# Altium footprint library connector_degson.PcbLib: 59 footprints (part 2 of 4)
Each footprint in its own frame and in the unit in brackets; x right, y up, seen from the top. Pads: shape width x height; smd on the part's side, far side on the other; paste and mask are expansions set on the pad; w line width, h text height; cw(c..) or ccw(c..) is an arc to the next point about the centre after c.
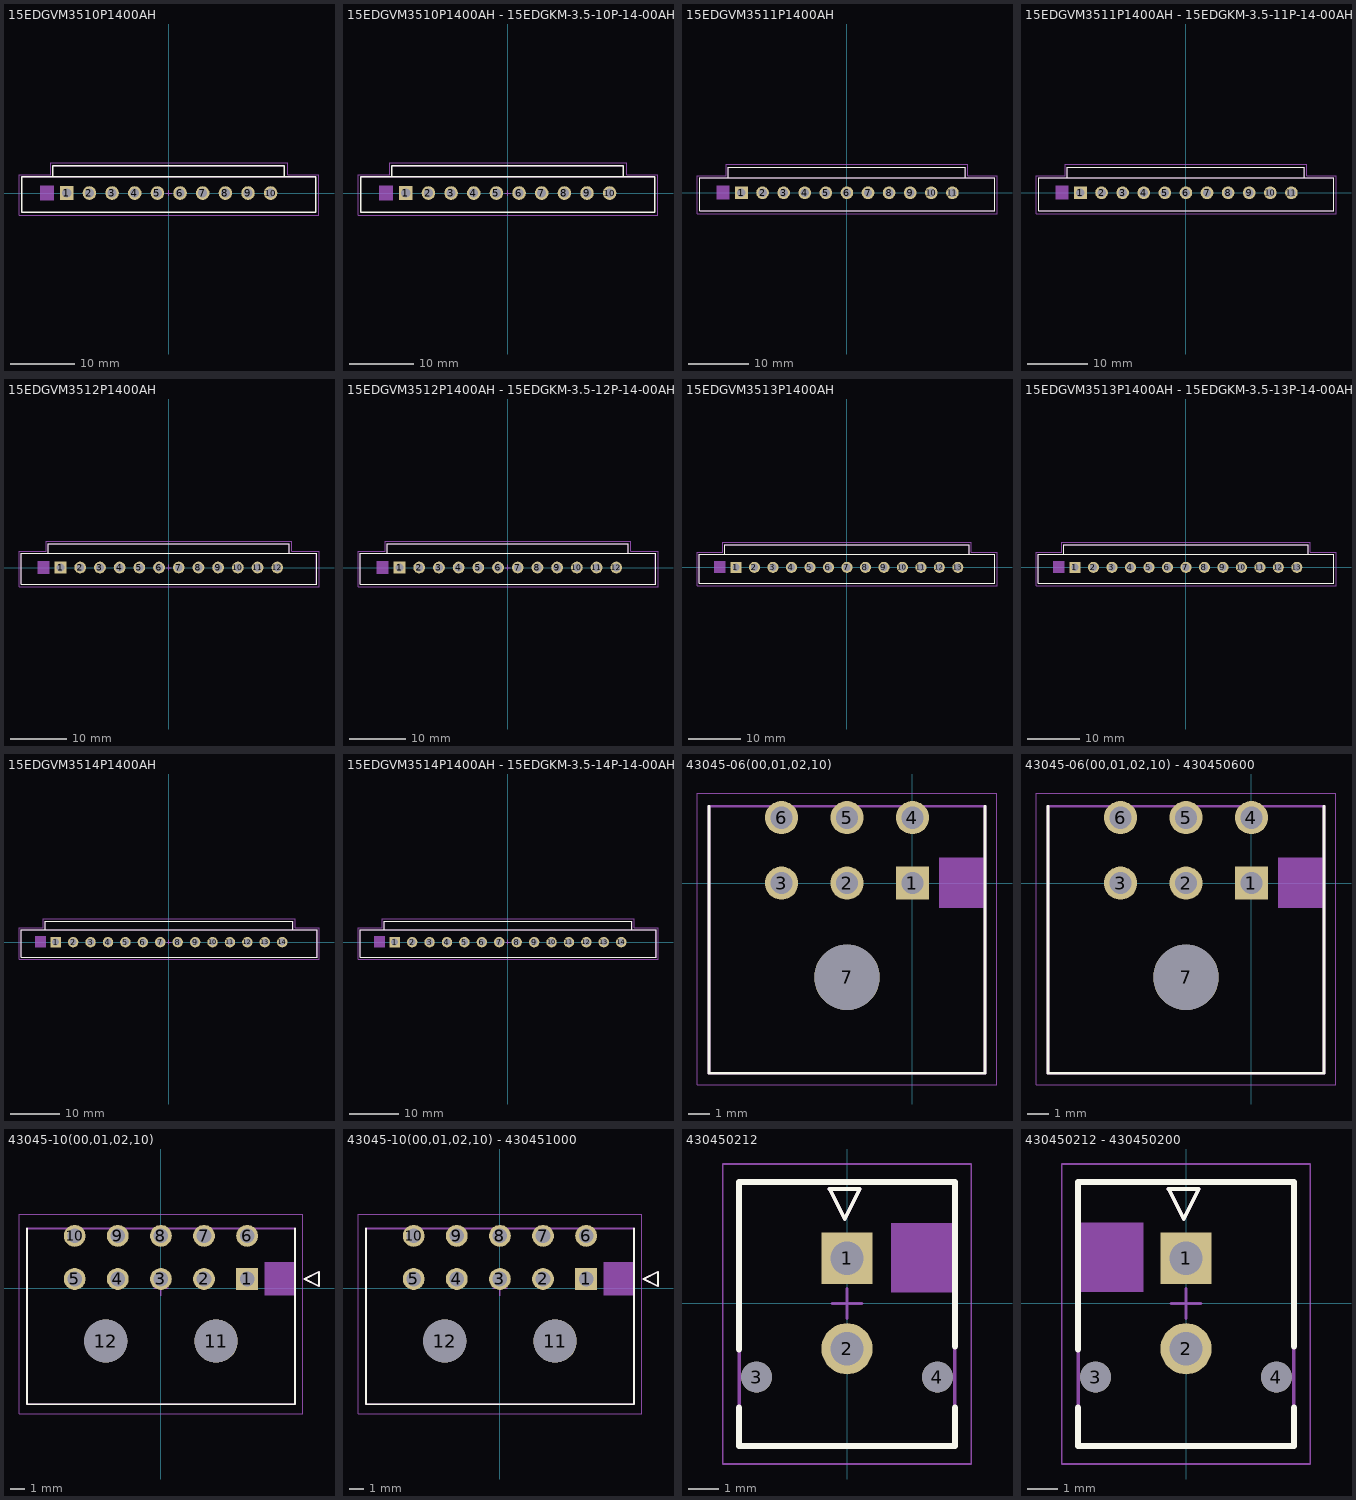
[diagram p1: the footprints below, top view; thin cyan lines are the x and y axes]

## 15EDGVM3510P1400AH [mm] "15EDGVM-3.5-10P-14-00A"
height 3.4
pads (10):
  rect 2.1x2.1 hole 1.4: 1(-15.75,0)
  round 2.1 hole 1.4: 2(-12.25,0) 3(-8.75,0) 4(-5.25,0) 5(-1.75,0) 6(1.75,0) 7(5.25,0) 8(8.75,0) 9(12.25,0) 10(15.75,0)
Top Overlay:
  lines w0.2: -17.9,2.5 -17.9,4.24 17.879,4.24 17.879,2.5 ; -22.7,-3 22.75,-3 22.75,2.5 -22.7,2.5 -22.7,-3
Top Designator:
  text ".Designator" at -24.849,3.475 h0.6
Top Assembly:
  rectangle: -19.866,-1.114 -17.708,1.192
  lines w0.1: -17.9,2.5 -17.9,4.24 17.928,4.24 17.928,2.5 ; -22.7,-3 22.75,-3 22.75,2.5 -22.7,2.5 -22.7,-3
Top Courtyard:
  lines w0.1: -23.125,-3.45 23.217,-3.45 23.217,2.85 18.354,2.85 18.354,4.7 -18.25,4.7 -18.25,2.85 -23.125,2.85 -23.125,-3.45
  lines w0.15: -0.45,0 0.45,0 ; 0,-0.45 0,0.45
3D body "15EDGVM-3.5-10P-14-00AH.STEP": height 9.35, standoff -3.3, extent -22.7,-3 22.7,4.2

## 15EDGVM3510P1400AH - 15EDGKM-3.5-10P-14-00AH [mm] "15EDGVM-3.5-10P-14-00A"
height 3.4
pads (10):
  rect 2.1x2.1 hole 1.4: 1(-15.75,0)
  round 2.1 hole 1.4: 2(-12.25,0) 3(-8.75,0) 4(-5.25,0) 5(-1.75,0) 6(1.75,0) 7(5.25,0) 8(8.75,0) 9(12.25,0) 10(15.75,0)
Top Overlay:
  lines w0.2: -17.9,2.5 -17.9,4.24 17.879,4.24 17.879,2.5 ; -22.7,-3 -22.7,2.5 22.75,2.5 22.75,-3 -22.7,-3
Top Designator:
  text ".Designator" at -24.849,3.475 h0.6
Top Assembly:
  rectangle: -19.866,-1.114 -17.708,1.192
  lines w0.1: -17.9,2.5 -17.9,4.24 17.928,4.24 17.928,2.5 ; -22.7,-3 -22.7,2.5 22.75,2.5 22.75,-3 -22.7,-3
Top Courtyard:
  lines w0.1: -23.125,-3.45 -23.125,2.85 -18.25,2.85 -18.25,4.7 18.354,4.7 18.354,2.85 23.217,2.85 23.217,-3.45 -23.125,-3.45
  lines w0.15: -0.45,0 0.45,0 ; 0,-0.45 0,0.45
3D body "15EDGKM-3.5-10P-14-00AH.STEP": height 18.6, standoff 3, extent -22.7,-6.6 22.7,4.5
3D body "15EDGVM-3.5-10P-14-00AH.STEP": height 9.35, standoff -3.3, extent -22.7,-3 22.7,4.2

## 15EDGVM3511P1400AH [mm] "15EDGVM-3.5-11P-14-00A"
height 3.4
pads (11):
  rect 2.1x2.1 hole 1.4: 1(-17.5,0)
  round 2.1 hole 1.4: 2(-14,0) 3(-10.5,0) 4(-7,0) 5(-3.5,0) 6(0,0) 7(3.5,0) 8(7,0) 9(10.5,0) 10(14,0) 11(17.5,0)
Top Overlay:
  lines w0.2: -19.65,2.5 -19.65,4.24 19.659,4.24 19.659,2.5 ; -24.45,-3 -24.45,2.5 24.5,2.5 24.5,-3 -24.45,-3
Top Designator:
  text ".Designator" at -26.599,3.475 h0.6
Top Assembly:
  rectangle: -21.616,-1.114 -19.458,1.192
  lines w0.1: -19.65,2.5 -19.65,4.24 19.716,4.24 19.716,2.5 ; -24.45,-3 -24.45,2.5 24.5,2.5 24.5,-3 -24.45,-3
Top Courtyard:
  lines w0.1: -24.875,-3.45 -24.875,2.85 -20,2.85 -20,4.7 20.058,4.7 20.058,2.85 24.902,2.85 24.902,-3.45 -24.875,-3.45
  lines w0.15: -0.45,0 0.45,0 ; 0,-0.45 0,0.45
3D body "15EDGVM-3.5-11P-14-00AH.STEP": height 9.35, standoff -3.3, extent -24.425,-3 24.475,4.2

## 15EDGVM3511P1400AH - 15EDGKM-3.5-11P-14-00AH [mm] "15EDGVM-3.5-11P-14-00A"
height 3.4
pads (11):
  rect 2.1x2.1 hole 1.4: 1(-17.5,0)
  round 2.1 hole 1.4: 2(-14,0) 3(-10.5,0) 4(-7,0) 5(-3.5,0) 6(0,0) 7(3.5,0) 8(7,0) 9(10.5,0) 10(14,0) 11(17.5,0)
Top Overlay:
  lines w0.2: -19.65,2.5 -19.65,4.24 19.659,4.24 19.659,2.5 ; -24.45,-3 24.5,-3 24.5,2.5 -24.45,2.5 -24.45,-3
Top Designator:
  text ".Designator" at -26.599,3.475 h0.6
Top Assembly:
  rectangle: -21.616,-1.114 -19.458,1.192
  lines w0.1: -19.65,2.5 -19.65,4.24 19.716,4.24 19.716,2.5 ; -24.45,-3 24.5,-3 24.5,2.5 -24.45,2.5 -24.45,-3
Top Courtyard:
  lines w0.1: -24.875,-3.45 24.902,-3.45 24.902,2.85 20.058,2.85 20.058,4.7 -20,4.7 -20,2.85 -24.875,2.85 -24.875,-3.45
  lines w0.15: -0.45,0 0.45,0 ; 0,-0.45 0,0.45
3D body "15EDGKM-3.5-11P-14-00AH.STEP": height 18.6, standoff 3, extent -24.45,-6.6 24.45,4.5
3D body "15EDGVM-3.5-11P-14-00AH.STEP": height 9.35, standoff -3.3, extent -24.425,-3 24.475,4.2

## 15EDGVM3512P1400AH [mm] "15EDGVM-3.5-12P-14-00A"
height 3.4
pads (12):
  rect 2.1x2.1 hole 1.4: 1(-19.25,0)
  round 2.1 hole 1.4: 2(-15.75,0) 3(-12.25,0) 4(-8.75,0) 5(-5.25,0) 6(-1.75,0) 7(1.75,0) 8(5.25,0) 9(8.75,0) 10(12.25,0) 11(15.75,0) 12(19.25,0)
Top Overlay:
  lines w0.2: -21.4,2.5 -21.4,4.24 21.4,4.24 21.4,2.5 ; -26.2,-3 -26.2,2.5 26.25,2.5 26.25,-3 -26.2,-3
Top Designator:
  text ".Designator" at -28.349,3.475 h0.6
Top Assembly:
  rectangle: -23.366,-1.114 -21.208,1.192
  lines w0.1: -21.4,2.5 -21.4,4.24 21.4,4.24 ; 26.2,-3 26.2,2.5 ; 21.4,4.24 21.4,2.5 21.4,4.24 ; -26.2,-3 -26.2,2.5 26.25,2.5 26.25,-3 -26.2,-3
Top Courtyard:
  lines w0.1: -26.625,-3.45 -26.625,2.85 -21.75,2.85 -21.75,4.7 21.844,4.7 21.844,2.85 26.663,2.85 26.663,-3.45 -26.625,-3.45
  lines w0.15: -0.45,0 0.45,0 ; 0,-0.45 0,0.45
3D body "15EDGVM-3.5-12P-14-00AH.STEP": height 9.35, standoff -3.3, extent -26.15,-3 26.25,4.2

## 15EDGVM3512P1400AH - 15EDGKM-3.5-12P-14-00AH [mm] "15EDGVM-3.5-12P-14-00A"
height 3.4
pads (12):
  rect 2.1x2.1 hole 1.4: 1(-19.25,0)
  round 2.1 hole 1.4: 2(-15.75,0) 3(-12.25,0) 4(-8.75,0) 5(-5.25,0) 6(-1.75,0) 7(1.75,0) 8(5.25,0) 9(8.75,0) 10(12.25,0) 11(15.75,0) 12(19.25,0)
Top Overlay:
  lines w0.2: -21.4,2.5 -21.4,4.24 21.4,4.24 21.4,2.5 ; -26.2,-3 26.25,-3 26.25,2.5 -26.2,2.5 -26.2,-3
Top Designator:
  text ".Designator" at -28.349,3.475 h0.6
Top Assembly:
  rectangle: -23.366,-1.114 -21.208,1.192
  lines w0.1: -21.4,2.5 -21.4,4.24 21.4,4.24 ; 26.2,-3 26.2,2.5 ; 21.4,4.24 21.4,2.5 21.4,4.24 ; -26.2,-3 26.25,-3 26.25,2.5 -26.2,2.5 -26.2,-3
Top Courtyard:
  lines w0.1: -26.625,-3.45 26.663,-3.45 26.663,2.85 21.844,2.85 21.844,4.7 -21.75,4.7 -21.75,2.85 -26.625,2.85 -26.625,-3.45
  lines w0.15: -0.45,0 0.45,0 ; 0,-0.45 0,0.45
3D body "15EDGKM-3.5-12P-14-00AH.STEP": height 18.6, standoff 3, extent -26.15,-6.6 26.25,4.5
3D body "15EDGVM-3.5-12P-14-00AH.STEP": height 9.35, standoff -3.3, extent -26.15,-3 26.25,4.2

## 15EDGVM3513P1400AH [mm] "15EDGVM-3.5-13P-14-00A"
height 3.4
pads (13):
  rect 2.1x2.1 hole 1.4: 1(-21,0)
  round 2.1 hole 1.4: 2(-17.5,0) 3(-14,0) 4(-10.5,0) 5(-7,0) 6(-3.5,0) 7(0,0) 8(3.5,0) 9(7,0) 10(10.5,0) 11(14,0) 12(17.5,0) 13(21,0)
Top Overlay:
  lines w0.2: -23.15,2.5 -23.15,4.24 23.156,4.24 23.156,2.5 ; 23.15,2.5 23.15,4.24 ; -27.95,-3 28,-3 28,2.5 -27.95,2.5 -27.95,-3
Top Designator:
  text ".Designator" at -30.099,3.475 h0.6
Top Assembly:
  rectangle: -25.116,-1.114 -22.958,1.192
  lines w0.1: -23.15,2.5 -23.15,4.24 23.137,4.24 23.137,2.5 ; 27.95,-3 27.95,2.5 ; -27.95,-3 28,-3 28,2.5 -27.95,2.5 -27.95,-3
Top Courtyard:
  lines w0.1: -28.375,-3.45 28.406,-3.45 28.406,2.85 23.541,2.85 23.541,4.7 -23.5,4.7 -23.5,2.85 -28.375,2.85 -28.375,-3.45
  lines w0.15: -0.45,0 0.45,0 ; 0,-0.45 0,0.45
3D body "15EDGVM-3.5-13P-14-00AH.STEP": height 9.35, standoff -3.3, extent -27.942,-3 27.958,4.2

## 15EDGVM3513P1400AH - 15EDGKM-3.5-13P-14-00AH [mm] "15EDGVM-3.5-13P-14-00A"
height 3.4
pads (13):
  rect 2.1x2.1 hole 1.4: 1(-21,0)
  round 2.1 hole 1.4: 2(-17.5,0) 3(-14,0) 4(-10.5,0) 5(-7,0) 6(-3.5,0) 7(0,0) 8(3.5,0) 9(7,0) 10(10.5,0) 11(14,0) 12(17.5,0) 13(21,0)
Top Overlay:
  lines w0.2: -23.15,2.5 -23.15,4.24 23.156,4.24 23.156,2.5 ; 23.15,2.5 23.15,4.24 ; -27.95,-3 28,-3 28,2.5 -27.95,2.5 -27.95,-3
Top Designator:
  text ".Designator" at -30.099,3.475 h0.6
Top Assembly:
  rectangle: -25.116,-1.114 -22.958,1.192
  lines w0.1: -23.15,2.5 -23.15,4.24 23.137,4.24 23.137,2.5 ; 27.95,-3 27.95,2.5 ; -27.95,-3 28,-3 28,2.5 -27.95,2.5 -27.95,-3
Top Courtyard:
  lines w0.1: -28.375,-3.45 28.406,-3.45 28.406,2.85 23.541,2.85 23.541,4.7 -23.5,4.7 -23.5,2.85 -28.375,2.85 -28.375,-3.45
  lines w0.15: -0.45,0 0.45,0 ; 0,-0.45 0,0.45
3D body "15EDGKM-3.5-13P-14-00AH.STEP": height 18.6, standoff 3, extent -27.95,-6.6 27.95,4.5
3D body "15EDGVM-3.5-13P-14-00AH.STEP": height 9.35, standoff -3.3, extent -27.942,-3 27.958,4.2

## 15EDGVM3514P1400AH [mm] "15EDGVM-3.5-14P-14-00A"
height 3.4
pads (14):
  rect 2.1x2.1 hole 1.4: 1(-22.75,0)
  round 2.1 hole 1.4: 2(-19.25,0) 3(-15.75,0) 4(-12.25,0) 5(-8.75,0) 6(-5.25,0) 7(-1.75,0) 8(1.75,0) 9(5.25,0) 10(8.75,0) 11(12.25,0) 12(15.75,0) 13(19.25,0) 14(22.75,0)
Top Overlay:
  lines w0.2: -24.9,2.5 -24.9,4.24 24.912,4.24 24.912,2.5 ; 24.9,2.5 24.9,4.24 ; -29.7,-3 -29.7,2.5 29.75,2.5 29.75,-3 -29.7,-3
Top Designator:
  text ".Designator" at -31.849,3.475 h0.6
Top Assembly:
  rectangle: -26.866,-1.114 -24.708,1.192
  lines w0.1: -24.9,2.5 -24.9,4.24 24.944,4.24 24.944,2.5 ; 29.7,-3 29.7,2.5 ; -29.7,-3 -29.7,2.5 29.75,2.5 29.75,-3 -29.7,-3
Top Courtyard:
  lines w0.1: -30.125,-3.45 -30.125,2.85 -25.25,2.85 -25.25,4.7 25.356,4.7 25.356,2.85 30.137,2.85 30.137,-3.45 -30.125,-3.45
  lines w0.15: -0.45,0 0.45,0 ; 0,-0.45 0,0.45
3D body "15EDGVM-3.5-14P-14-00AH.STEP": height 9.35, standoff -3.3, extent -29.675,-3 29.725,4.2

## 15EDGVM3514P1400AH - 15EDGKM-3.5-14P-14-00AH [mm] "15EDGVM-3.5-14P-14-00A"
height 3.4
pads (14):
  rect 2.1x2.1 hole 1.4: 1(-22.75,0)
  round 2.1 hole 1.4: 2(-19.25,0) 3(-15.75,0) 4(-12.25,0) 5(-8.75,0) 6(-5.25,0) 7(-1.75,0) 8(1.75,0) 9(5.25,0) 10(8.75,0) 11(12.25,0) 12(15.75,0) 13(19.25,0) 14(22.75,0)
Top Overlay:
  lines w0.2: -24.9,2.5 -24.9,4.24 24.912,4.24 24.912,2.5 ; 24.9,2.5 24.9,4.24 ; -29.7,-3 -29.7,2.5 29.75,2.5 29.75,-3 -29.7,-3
Top Designator:
  text ".Designator" at -31.849,3.475 h0.6
Top Assembly:
  rectangle: -26.866,-1.114 -24.708,1.192
  lines w0.1: -24.9,2.5 -24.9,4.24 24.944,4.24 24.944,2.5 ; 29.7,-3 29.7,2.5 ; -29.7,-3 -29.7,2.5 29.75,2.5 29.75,-3 -29.7,-3
Top Courtyard:
  lines w0.1: -30.125,-3.45 -30.125,2.85 -25.25,2.85 -25.25,4.7 25.356,4.7 25.356,2.85 30.137,2.85 30.137,-3.45 -30.125,-3.45
  lines w0.15: -0.45,0 0.45,0 ; 0,-0.45 0,0.45
3D body "15EDGVM-3.5-14P-14-00AH.STEP": height 9.35, standoff -3.3, extent -29.675,-3 29.725,4.2
3D body "15EDGKM-3.5-14P-14-00AH.STEP": height 18.6, standoff 3, extent -29.675,-6.6 29.725,4.5

## 43045-06(00,01,02,10) [mm]
pads (7):
  rect 1.52x1.52 hole 1.02: 1(0,0)
  round 1.52 hole 1.02: 2(-3,0) 3(-6,0) 4(0,3) 5(-3,3) 6(-6,3)
  round 3 hole 3 unplated: 7(-3,-4.32)
Top Overlay:
  lines w0.127: -9.325,3.52 -9.325,-8.72 3.325,-8.72 3.325,3.52
Top Assembly:
  region: 3.371,1.164 1.213,1.164 1.213,-1.142 3.371,-1.142
  lines w0.127: -9.325,-8.72 -9.325,3.52 3.325,3.52 3.325,-8.72 -9.325,-8.72
Top Courtyard:
  lines w0.05: -9.875,-9.25 -9.875,4.125 3.875,4.125 3.875,-9.25 -9.875,-9.25
3D body "43045-0602.stp": height 8.69, standoff -3.26, extent -9.585,-8.905 3.565,3.335

## 43045-06(00,01,02,10) - 430450600 [mm]
pads (7):
  rect 1.52x1.52 hole 1.02: 1(0,0)
  round 1.52 hole 1.02: 2(-3,0) 3(-6,0) 4(0,3) 5(-3,3) 6(-6,3)
  round 3 hole 3 unplated: 7(-3,-4.32)
Top Overlay:
  lines w0.127: -9.325,3.52 -9.325,-8.72 3.325,-8.72 3.325,3.52
Top Assembly:
  region: 3.371,1.164 1.213,1.164 1.213,-1.142 3.371,-1.142
  lines w0.127: -9.325,-8.72 -9.325,3.52 3.325,3.52 3.325,-8.72 -9.325,-8.72
Top Courtyard:
  lines w0.05: -9.875,-9.25 -9.875,4.125 3.875,4.125 3.875,-9.25 -9.875,-9.25
3D body "43045-0602.stp": height 8.69, standoff -3.26, extent -9.585,-8.905 3.565,3.335
3D body "0430250600.stp": height 10.7, standoff -0.13, extent -7.92,-16.7 1.93,-2.7

## 43045-10(00,01,02,10) [mm]
pads (12):
  rect 1.52x1.52 hole 1.02: 1(6,0.66)
  round 1.52 hole 1.02: 2(3,0.66) 3(0,0.66) 4(-3,0.66) 5(-6,0.66) 6(6,3.66) 7(3,3.66) 8(0,3.66) 9(-3,3.66) 10(-6,3.66)
  round 3 hole 3 unplated: 11(3.84,-3.66) 12(-3.84,-3.66)
Top Overlay:
  lines w0.127: -9.325,4.18 -9.325,-8.06 9.325,-8.06 9.325,4.18 ; 10,0.66 11,1.16 11,0.16 10,0.66
Top Designator:
  text ".Designator" at -8.874,5.675 h0.6
Top Assembly:
  region: 9.371,1.824 7.213,1.824 7.213,-0.482 9.371,-0.482
  lines w0.127: -9.325,-8.06 -9.325,4.18 9.325,4.18 9.325,-8.06 -9.325,-8.06 ; 10,0.66 11,1.16 11,0.16 10,0.66
Top Courtyard:
  lines w0.05: -9.875,-8.715 -9.875,5.16 9.875,5.16 9.875,-8.715 -9.875,-8.715
  lines w0.1: -0.5,0 0.5,0 ; 0,-0.5 0,0.5
3D body "43045-1000.stp": height 8.67, standoff -3.28, extent -9.6,-8.27 9.55,3.97

## 43045-10(00,01,02,10) - 430451000 [mm]
pads (12):
  rect 1.52x1.52 hole 1.02: 1(6,0.66)
  round 1.52 hole 1.02: 2(3,0.66) 3(0,0.66) 4(-3,0.66) 5(-6,0.66) 6(6,3.66) 7(3,3.66) 8(0,3.66) 9(-3,3.66) 10(-6,3.66)
  round 3 hole 3 unplated: 11(3.84,-3.66) 12(-3.84,-3.66)
Top Overlay:
  lines w0.127: -9.325,4.18 -9.325,-8.06 9.325,-8.06 9.325,4.18 ; 10,0.66 11,0.16 11,1.16 10,0.66
Top Designator:
  text ".Designator" at -8.874,5.675 h0.6
Top Assembly:
  region: 9.371,1.824 7.213,1.824 7.213,-0.482 9.371,-0.482
  lines w0.127: -9.325,-8.06 9.325,-8.06 9.325,4.18 -9.325,4.18 -9.325,-8.06 ; 10,0.66 11,0.16 11,1.16 10,0.66
Top Courtyard:
  lines w0.05: -9.875,-8.715 9.875,-8.715 9.875,5.16 -9.875,5.16 -9.875,-8.715
  lines w0.1: -0.5,0 0.5,0 ; 0,-0.5 0,0.5
3D body "43045-1000.stp": height 8.67, standoff -3.28, extent -9.6,-8.27 9.55,3.97
3D body "0430251000.stp": height 10.7, standoff -0.13, extent -7.92,-16.1 7.93,-2.1

## 430450212 [mm] "Micro-Fit 3.0 Vertical Header, 3.00mm Pitch, Dual Row,  with PCB Polarizing Peg, 1.52µm Matte Tin Plating, Glow-Wire Capable, Black"
pads (4):
  rect 1.7x1.7 hole 1.1: 1(0,1.5)
  round 1.7 hole 1.1: 2(0,-1.5)
  round 1.02 hole 1.02: 3(-3,-2.44) 4(3,-2.44)
Top Overlay:
  lines w0.127: -0.575,3.8 0.425,3.8 -0.075,2.8 -0.575,3.8
  lines w0.2: -3.575,-3.45 -3.575,-4.725 3.575,-4.725 3.575,-3.45 ; -3.575,-1.525 -3.575,4.025 3.575,4.025 3.575,-1.42
Route Tool Path:
  text "%R" at 0.499,1.872 h1.27
Top Designator:
  text ".Designator" at -2.992,5.104 h0.6
Top Assembly:
  region: 3.619,2.662 1.462,2.662 1.462,0.357 3.619,0.357
  lines w0.127: -3.575,-4.75 -3.575,4 3.575,4 3.575,-4.75 -3.575,-4.75 ; -0.575,3.8 0.425,3.8 -0.075,2.8 -0.575,3.8
Top Courtyard:
  lines w0.05: -4.125,-5.325 4.125,-5.325 4.125,4.625 -4.125,4.625 -4.125,-5.325
  lines w0.1: -0.5,0 0.5,0 ; 0,-0.5 0,0.5
3D body "0430450212.stp": height 10.05, standoff -3.04, extent -3.575,-4.83 3.575,3.94

## 430450212 - 430450200 [mm] "Micro-Fit 3.0 Vertical Header, 3.00mm Pitch, Dual Row,  with PCB Polarizing Peg, 1.52µm Matte Tin Plating, Glow-Wire Capable, Black"
pads (4):
  rect 1.7x1.7 hole 1.1: 1(0,1.5)
  round 1.7 hole 1.1: 2(0,-1.5)
  round 1.02 hole 1.02: 3(-3,-2.44) 4(3,-2.44)
Top Overlay:
  lines w0.127: -0.575,3.8 -0.075,2.8 0.425,3.8 -0.575,3.8
  lines w0.2: -3.575,-3.45 -3.575,-4.725 3.575,-4.725 3.575,-3.45 ; -3.575,-1.525 -3.575,4.025 3.575,4.025 3.575,-1.42
Route Tool Path:
  text "%R" at 0.499,1.872 h1.27
Top Designator:
  text ".Designator" at -2.992,5.104 h0.6
Top Assembly:
  rectangle: -3.562,0.372 -1.404,2.678
  lines w0.127: -3.575,-4.75 3.575,-4.75 3.575,4 -3.575,4 -3.575,-4.75 ; -0.575,3.8 0.425,3.8 -0.075,2.8 -0.575,3.8
Top Courtyard:
  lines w0.05: -4.125,-5.325 -4.125,4.625 4.125,4.625 4.125,-5.325 -4.125,-5.325
  lines w0.1: -0.5,0 0.5,0 ; 0,-0.5 0,0.5
3D body "0430450212.stp": height 10.05, standoff -3.04, extent -3.575,-4.83 3.575,3.94
3D body "0430250200.stp": height 17.8, standoff 3.8, extent -2.645,-6.7 2.635,4.13